# Altium schematic symbol library NXP_60_26022015.SCHLIB: 1306 symbols (part 27 of 28) (continued)
## SSL5511T
designator U?, comment Greenchip controller for LED lighting with DIM pin The SSL5511T is an offline dimmable controller IC, intended to drive dimmable LEDs in general lighting applications, like remote-controlled luminaires and smart lamps. The main benefits of this IC include: • Dim level control with either an analog or a digital control input • Selectable modes for high power factor or low ripple, allowing a wide LED power range • Large dimming range • Single stage topology for small PCB footprint • Ease of design-in • Integrated start-up JFET • Low electronic Bill Of Material (BOM) • Various converter topologies supported The IC drives an external switch for easy power scaling. It has been designed to start up directly from the High-Voltage (HV) supply by an internal high-voltage current source. Flyback, buck and buck-boost circuit topologies are supported. Primary side sensing provides accurate output current control. The IC can detect analog signals (according to IEC60929 annex E) or digital control signals and translate them to a continuous LED current in multiple ways. It can operate in three switching modes at two switching frequency ranges. It offers tradeoffs between the output current ripple, the mains current Total Harmonic Distortion (THD) and the application size. The IC incorporates all required protection features.    AAL Eindhoven MK
footprint SOT96-1
pins: 1 RMAINS (power), 2 VCC (power), 3 DIM, 4 TST, 5 ISNS, 6 PWRDRV (out), 7 GND (power), 8 DRAIN

## SSL8516T
designator U?, comment Greenchip PFC and flyback controller The GreenChip is the latest generation of green Switched Mode Power Supply (SMPS) controller ICs. The SSL8516T combines a controller for Power Factor Correction (PFC) and a flyback controller. Its high level of integration enables cost-effective LED lighting application power supply design using a very low number of external components. The PFC operates in Quasi-Resonant (QR) or Discontinuous Conduction Mode (DCM), with valley switching. The specially built-in green functions provide high efficiency at all power levels. At high power levels, the flyback operates in QR mode or DCM with valley detection. At medium power levels, the flyback controller switches to Frequency Reduction (FR) mode and limits the peak current to an adjustable minimum value. It ensures high efficiency while minimizing the audible noise from the transformer. In low-power mode, the PFC switches off to maintain high efficiency. Valley switching is used in all operating modes. The SSL8516T is a Multi-Chip Module (MCM), containing two chips. The proprietary high-voltage BCD800 process makes direct start-up possible from the rectified universal mains voltage in an effective and green way. The second low voltage Silicon-On-Insulator (SOI) is used for accurate, high-speed protection functions and control. The SSL8516T enables easy design of highly efficient and reliable LED lighting application power supplies between 25 W and 300 W. LED drivers in particular benefit from the high level of integration. The IC meets the lighting class C requirements on mains current harmonics as specified by IEC 61000-3-2 over a wide input voltage range and a wide output power range.    AAL Eindhoven MK
footprint SOT109-1
pins: 1 VCC (power), 2 GND (power), 3 FBCTRL, 4 FBAUX, 5 LATCH, 6 PFCCOMP, 7 VINSENSE, 8 PCFAUX, 9 VOSENSE, 10 FBSENSE, 11 PFCSENSE, 12 PFCDRIVER (out), 13 FBDRIVER (out), 14 PFCTIMER, 15 HVS, 16 HV

## TDA8037T
designator U?, comment Low power 3V smart card interface The TDA8037 is the cost efficient successor of the established integrated contact smart card reader IC TDA8035. It offers a high level of security for the card performing current limitation, short circuit detection, ESD protection as well as supply supervision. Operating in 3 V supply domain, the current consumption during the shutdown mode of the contact reader is very low. It is therefore the ideal component for a power efficient contact reader.   AAL Eindhoven MK
footprint SOT136-1
pins: 1 CLKDIV, 4 TEST, 6 VDD, 9 !PRES, 11 I/O, 12 AUX2, 13 AUX1, 14 GND, 15 CLK (out), 16 RST (out), 17 VCC, 18 PORADJ (out), 19 !CMDVCC, 20 RSTIN, 21 CS, 23 !OFF (out), 24 CLKIN, 26 I/OUC, 27 AUX1UC, 28 AUX2UC

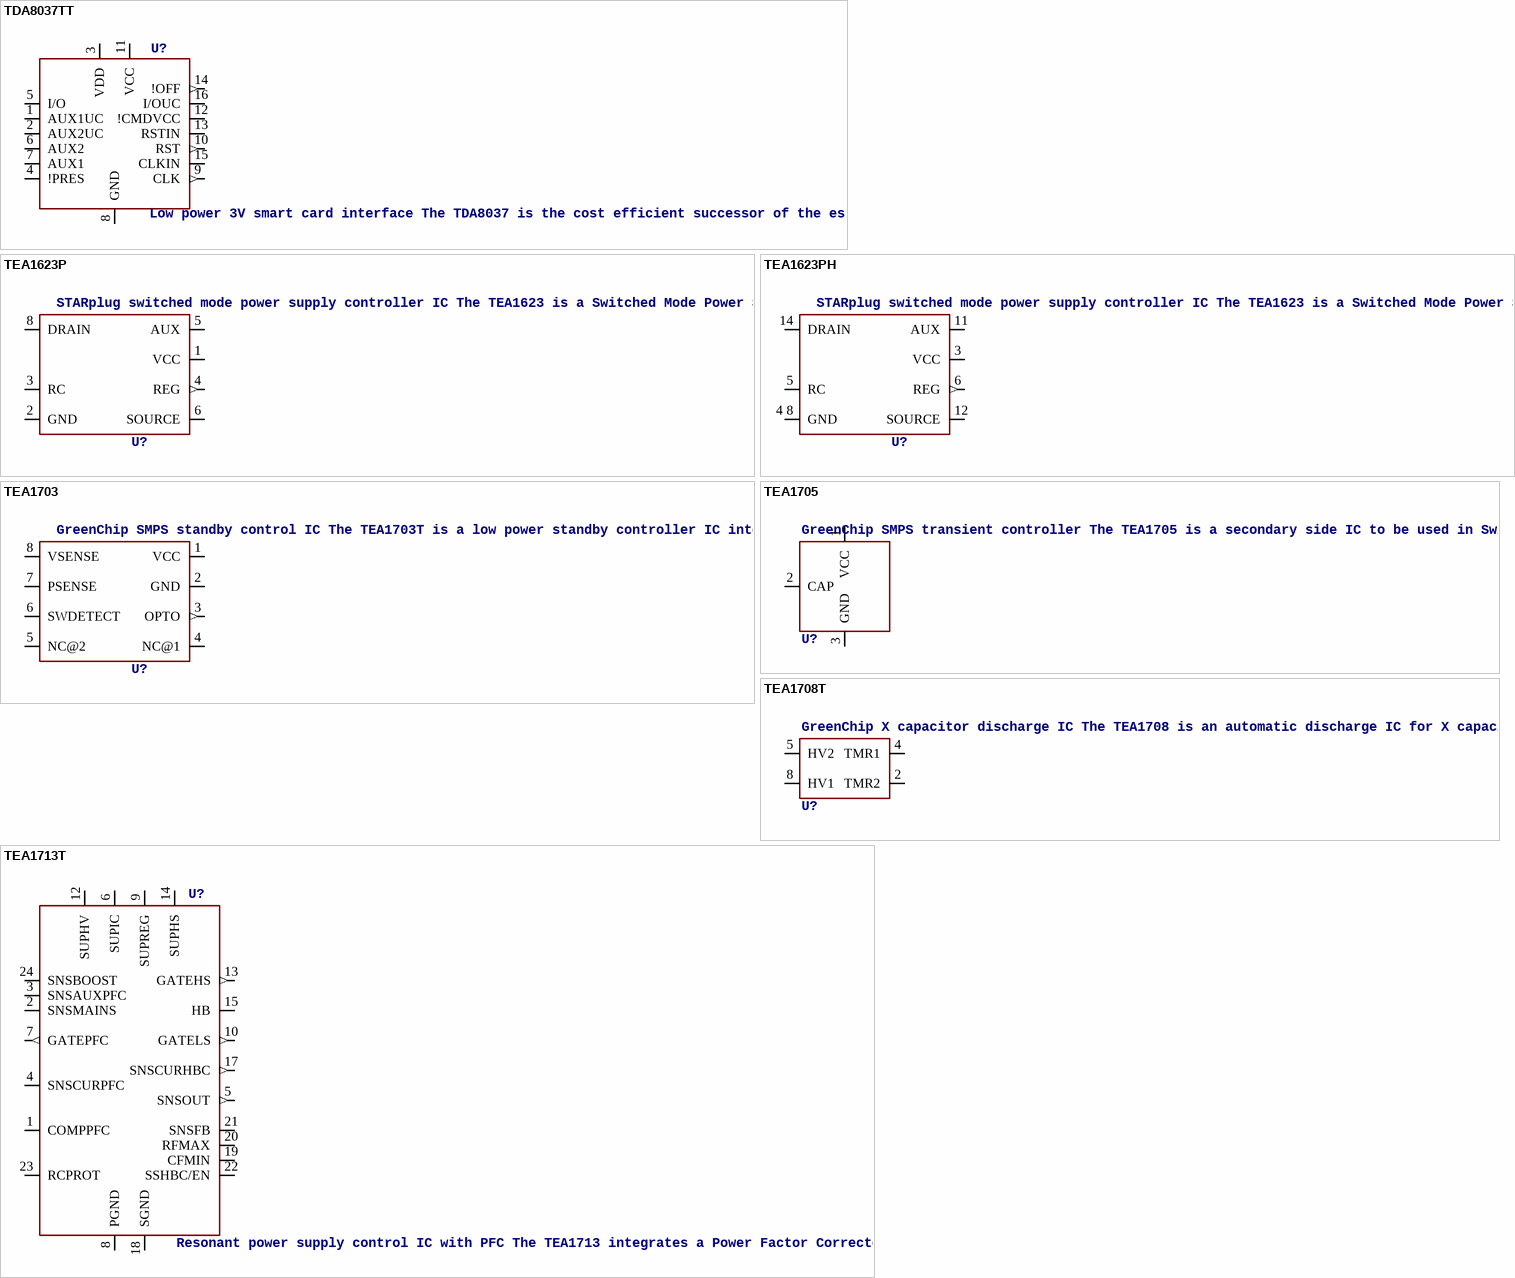
[diagram p180: symbols TDA8037TT to TEA1713T]

## TDA8037TT
designator U?, comment Low power 3V smart card interface The TDA8037 is the cost efficient successor of the established integrated contact smart card reader IC TDA8035. It offers a high level of security for the card performing current limitation, short circuit detection, ESD protection as well as supply supervision. Operating in 3 V supply domain, the current consumption during the shutdown mode of the contact reader is very low. It is therefore the ideal component for a power efficient contact reader.   AAL Eindhoven MK
footprint SOT403-1
pins: 1 AUX1UC, 2 AUX2UC, 3 VDD, 4 !PRES, 5 I/O, 6 AUX2, 7 AUX1, 8 GND, 9 CLK (out), 10 RST (out), 11 VCC, 12 !CMDVCC, 13 RSTIN, 14 !OFF (out), 15 CLKIN, 16 I/OUC

## TEA1623P
designator U?, comment STARplug switched mode power supply controller IC The TEA1623 is a Switched Mode Power Supply (SMPS) controller IC that operates directly from rectified universal mains. It is implemented in the high voltage EZ-HV SOI process, combined with a low voltage BiCMOS process. The device includes a high voltage power switch and a circuit for start-up directly from the rectified mains voltage. A dedicated circuit for valley switching is built in, which makes a very efficient slim-line electronic power-plug concept possible. In its most basic version of application, the TEA1623 acts as a voltage source. Here, no additional secondary electronics are required. A combined voltage and current source can be realized with minimum costs for external components. Implementation of the TEA1623 renders an efficient and low cost power supply system.    AAL Eindhoven MK
footprint SOT97-1
pins: 1 VCC (power), 2 GND, 3 RC, 4 REG (out), 5 AUX, 6 SOURCE, 8 DRAIN

## TEA1623PH
designator U?, comment STARplug switched mode power supply controller IC The TEA1623 is a Switched Mode Power Supply (SMPS) controller IC that operates directly from rectified universal mains. It is implemented in the high voltage EZ-HV SOI process, combined with a low voltage BiCMOS process. The device includes a high voltage power switch and a circuit for start-up directly from the rectified mains voltage. A dedicated circuit for valley switching is built in, which makes a very efficient slim-line electronic power-plug concept possible. In its most basic version of application, the TEA1623 acts as a voltage source. Here, no additional secondary electronics are required. A combined voltage and current source can be realized with minimum costs for external components. Implementation of the TEA1623 renders an efficient and low cost power supply system.    AAL Eindhoven MK
footprint SOT38
pins: 3 VCC (power), 4 8 GND, 5 RC, 6 REG (out), 11 AUX, 12 SOURCE, 14 DRAIN

## TEA1703
designator U?, comment GreenChip SMPS standby control IC The TEA1703T is a low power standby controller IC intended to be used in applications which require an extreme low no-load standby power. The TEA1703T includes circuitry for detecting output voltage, output power and switching. The TEA1703T integrates a switched-mode optocoupler driver, which enables an optocoupler to be driven with a high peak current while keeping the required power low1 . The TEA1703T’s typical current consumption is 30 μA. In a typical notebook adapter application the TEA1703T’s power consumption is less than 0.5 mW.    AAL Eindhoven MK
footprint SOT96-1
pins: 1 VCC (power), 2 GND (power), 3 OPTO (out), 4 NC@1, 5 NC@2, 6 SWDETECT, 7 PSENSE, 8 VSENSE

## TEA1705
designator U?, comment GreenChip SMPS transient controller The TEA1705 is a secondary side IC to be used in Switched Mode Power Supplies (SMPS) with high power density. The device offers excellent transient response in primary controlled systems of NXP Semiconductors, with ultra-low no-load power and minimum sized output capacitors. The TEA1705 is intended to be used in power supplies and battery chargers with 5 V output. The TEA1705 operates in combination with the NXP Semiconductors primary-side controller like the TEA1720xT. The output voltage is continuously monitored and when the output voltage is below the Vdet level, a transient interrupt signal is generated. This signal is transmitted via the transformer to the primary side to wake up the primary controller. This system reduces the volume of the output capacitors, minimizing the BOM cost. It also enables the building of compact chargers.    AAL Eindhoven MK
footprint SOT23
pins: 1 VCC (power), 2 CAP, 3 GND (power)

## TEA1708T
designator U?, comment GreenChip X capacitor discharge IC The TEA1708 is an automatic discharge IC for X capacitors with a low power consumption (typically 1 mW at 230 V (AC). A 500 V clamping circuit is integrated, protecting the IC during mains surges. In a typical application with only two 200 k resistors, the maximum differential mode mains surge voltage allowed exceeds 6 kV. A metal oxide varistor is not required to protect the IC. The X capacitor discharge current is internally limited to 2.3 mA. The discharge delay timer is set externally using a low voltage capacitor. The very low power consumption in combination with a large discharge current enables the use of a large value X capacitor to reduce EMI while retaining the low standby power.    AAL Eindhoven MK
footprint SOT96-1
pins: 2 TMR2, 4 TMR1, 5 HV2, 8 HV1

## TEA1713T
designator U?, comment Resonant power supply control IC with PFC The TEA1713 integrates a Power Factor Corrector (PFC) controller and a controller for a Half-Bridge resonant Converter (HBC) in a multi-chip IC. It provides the drive function for the discrete MOSFET in an up-converter and for the two discrete power MOSFETs in a resonant half-bridge configuration. The efficient operation of the PFC is achieved by implementing functions such as quasi-resonant operation at high power levels and quasi-resonant operation with valley skipping at lower power levels. OverCurrent Protection (OCP), OverVoltage Protection (OVP), and demagnetization sensing ensure safe operation under all conditions. The HBC module is a is a high-voltage controller for a zero-voltage switching LLC resonant converter. It contains a high-voltage level shift circuit and several protection circuits including OCP, open-loop protection, capacitive mode protection and a general purpose latched protection input. The high-voltage chip is fabricated using a proprietary high-voltage Bipolar-CMOS-DMOS power logic process that enables efficient direct start-up from the rectified universal mains voltage. The low-voltage Silicon On Insulator (SOI) chip is used for accurate, high-speed protection functions and control. The topology of a PFC circuit and a resonant converter controlled by the TEA1713 is very flexible, enabling it to be used in a broad range of applications with a wide mains voltage range. Combining PFC and HBC controllers in a single IC makes the TEA1713 ideal for controlling power supplies in LCD and plasma televisions. Highly efficient and reliable power supplies providing over 100 W can be designed easily using the TEA1713, with a minimum of external components.    AAL Eindhoven MK
12NC: 9352 895 98518; FARNELL: 1872212
footprint SOT137-1
pins: 1 COMPPFC, 2 SNSMAINS, 3 SNSAUXPFC, 4 SNSCURPFC, 5 SNSOUT (out), 6 SUPIC (power), 7 GATEPFC (out), 8 PGND (power), 9 SUPREG, 10 GATELS (out), 12 SUPHV, 13 GATEHS (out), 14 SUPHS, 15 HB, 17 SNSCURHBC (out), 18 SGND (power), 19 CFMIN, 20 RFMAX, 21 SNSFB, 22 SSHBC/EN, 23 RCPROT, 24 SNSBOOST

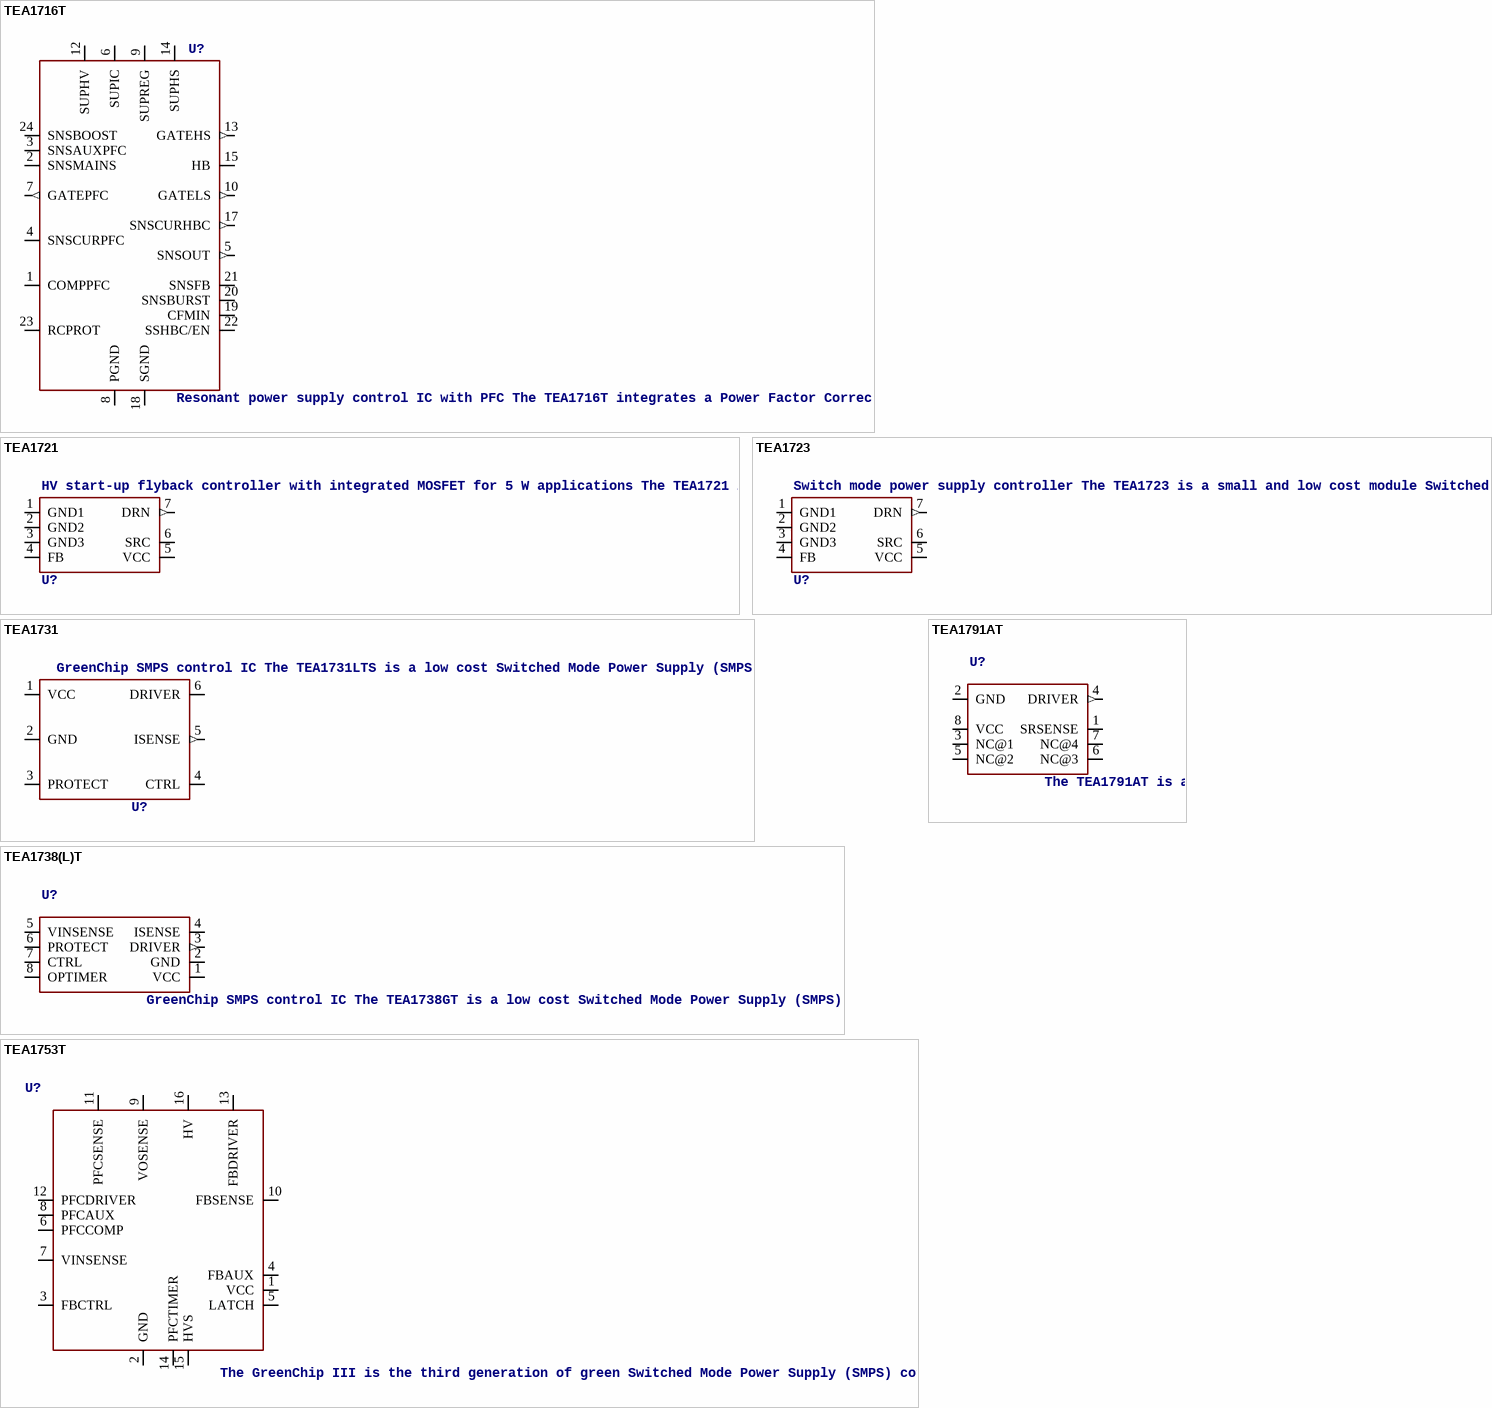
[diagram p181: symbols TEA1716T to TEA1791AT]

## TEA1716T
designator U?, comment Resonant power supply control IC with PFC The TEA1716T integrates a Power Factor Corrector (PFC) controller and a controller for a Half-Bridge resonant Converter (HBC) in a multi-chip IC. It provides the drive function for the discrete MOSFET in an up-converter and for the two discrete power MOSFETs in a resonant half-bridge configuration. Efficient PFC operation is achieved by implementing functions for Quasi-Resonant (QR) operation at high-power levels and QR operation with valley skipping at lower power levels. OverCurrent Protection (OCP), OverVoltage Protection (OVP) and demagnetization sensing ensure safe operation under all conditions. The HBC module is a high-voltage controller for a zero-voltage switching LLC resonant converter. It contains a high-voltage level shift circuit and several protection circuits including OCP, open-loop protection, capacitive mode protection and a general purpose latched protection input. The high-voltage chip is fabricated using a proprietary high-voltage Bipolar-CMOS-DMOS power logic process enabling efficient direct start-up from the rectified universal mains voltage. The low-voltage Silicon-On-Insulator (SOI) chip is used for accurate, high-speed protection functions and control. TEA1716T controlled PFC circuit and resonant converter are very flexible. It can be used for a broad range of applications over a wide mains voltage range. Combining PFC and HBC controllers in a single IC makes the TEA1716T ideal for controlling power supplies in LCD and plasma televisions. Using the TEA1716T highly efficient and reliable power supplies providing from 90 W to 500 W can be designed easily using the TEA1716T, with a minimum of external components. The integrated Burst mode and power management functionality of TEA1716T enable resonant applications that meet the Energy Using Product Directive (EuP) lot 6 (< 0.5 W in Standby mode).   AAL Eindhoven MK
footprint SOT137-1
pins: 1 COMPPFC, 2 SNSMAINS, 3 SNSAUXPFC, 4 SNSCURPFC, 5 SNSOUT (out), 6 SUPIC (power), 7 GATEPFC (out), 8 PGND (power), 9 SUPREG, 10 GATELS (out), 12 SUPHV, 13 GATEHS (out), 14 SUPHS, 15 HB, 17 SNSCURHBC (out), 18 SGND (power), 19 CFMIN, 20 SNSBURST, 21 SNSFB, 22 SSHBC/EN, 23 RCPROT, 24 SNSBOOST

## TEA1721
designator U?, comment HV start-up flyback controller with integrated MOSFET for 5 W applications The TEA1721 is a small and low cost module Switched Mode Power Supply (SMPS) controller IC for low power applications (up to 5 W) and operates directly from the rectified universal mains input. The device includes a high voltage power switch (700 V) and has been optimized for flyback converter topologies to provide high-efficiency over the entire load range with ultra-low power consumption in the no-load condition. It provides a circuit for start-up directly from the rectified mains voltage without any external bleeder circuits. The converter operates as a regulated voltage source from no-load up to the maximum output current and operates as current source that delivers the maximum current over a broad output voltage range. Using the TEA1721, a low power converter can be built at minimum cost and with the minimum number of external components. The controller regulates the output voltage with primary-side sensing which eliminates the need for an additional secondary feedback circuitry and simplifies the design. At higher power levels, a frequency and current control mode is used. It operates with Burst mode control at low power levels and no-load condition. The burst mode minimizes audible noise and provides an energy saver state which reduces the power consumption in no-load condition.    AAL Eindhoven MK
12NC: 9352 968 88118; BURST: 430 Hz; 12NC: 9352 968 94118; BURST: 905 Hz; 12NC: 9352 968 89118; BURST: 1270 Hz; 12NC: 9352 968 87118; BURST: 1750 Hz
footprint SOT1175-1
pins: 1 GND1 (power), 2 GND2 (power), 3 GND3 (power), 4 FB, 5 VCC (power), 6 SRC, 7 DRN (out)

## TEA1723
designator U?, comment Switch mode power supply controller The TEA1723 is a small and low cost module Switched Mode Power Supply (SMPS) controller IC for power applications (up to 11 W) and operates directly from the rectified universal mains input. The device includes a high voltage power switch (700 V) and has been optimized for flyback converter topologies to provide high-efficiency over the entire load range with ultra-low power consumption in the no-load condition. It provides a circuit for start-up directly from the rectified mains voltage without any external bleeder circuits. The converter operates as a regulated voltage source from no-load up to the maximum output current and operates as current source that delivers the maximum current over a broad output voltage range. Using the TEA1723, a low power converter can be built at minimum cost and with the minimum number of external components. The controller regulates the output voltage with primary-side sensing which eliminates the need for an additional secondary feedback circuitry and simplifies the design. At higher power levels, a frequency and current control mode is used. It operates with burst mode control at low power levels and no-load condition. The burst mode minimizes audible noise and provides an energy saver state which reduces the power consumption in no-load condition. The Burst mode frequency of 1750 Hz enables no-load power consumption < 53 mW at 230 V (AC) mains input.    AAL Eindhoven MK
12NC: 9352 968 88118
footprint SOT1175-1
pins: 1 GND1 (power), 2 GND2 (power), 3 GND3 (power), 4 FB, 5 VCC (power), 6 SRC, 7 DRN (out)

## TEA1731
designator U?, comment GreenChip SMPS control IC The TEA1731LTS is a low cost Switched Mode Power Supply (SMPS) controller IC intended for flyback topologies. The TEA1731LTS operates in peak current and frequency control mode. Frequency jitter has been implemented to reduce ElectroMagnetic Interference (EMI). Slope compensation is integrated for Continuous Conduction Mode (CCM) operation. The TEA1731LTS IC features OverPower Protection (OPP). The controller accepts an overpower situation for a limited amount of time. One pin is reserved for protection purposes. OverTemperature Protection (OTP) can be implemented with a minimal number of external components. At low-power levels, the primary peak current is set to 25 % of the maximum peak current. The switching frequency is reduced to limit the switching losses. The combination of fixed frequency operation at high output power and frequency reduction at low output power provides high efficiency over the total load range. The TEA1731LTS makes the design of low cost, highly efficient and reliable supplies for power requirements up to 75 W easier by requiring a minimum number of external components.    AAL Eindhoven MK
12NC: 9352 965 45115; 12NC: 9352 965 44115; FARNELL: 2142714
footprint SOT457
pins: 1 VCC (power), 2 GND, 3 PROTECT, 4 CTRL, 5 ISENSE (out), 6 DRIVER

## TEA1738(L)T
designator U?, comment GreenChip SMPS control IC The TEA1738GT is a low cost Switched Mode Power Supply (SMPS) controller IC intended for flyback topologies. It operates in peak current and frequency control mode. Frequency jitter has been implemented to reduce ElectroMagnetic Interference (EMI). Slope compensation is integrated for Continuous Conduction Mode (CCM) operation. The TEA1738GT IC includes OverPower Protection (OPP). This enables the controller to operate under overpower situations for a limited amount of time. Two pins, VINSENSE and PROTECT, are reserved for protection purposes. Input UnderVoltage Protection (UVP), output OverVoltage Protection (OVP) and OverTemperature Protection (OTP) can be implemented using a minimal number of external components. At low power levels the primary peak current is set to 25 % of the maximum peak current and the switching frequency is reduced to limit switching losses. The combination of fixed frequency operation at high output power and frequency reduction at low output power provides high efficiency over the total load range. The TEA1738GT enables low cost, highly efficient and reliable supplies for power requirements up to 75 W to be designed easily and with a minimum number of external components. The TEA1738GT is intended to operate in combination with a standby power supply. It has a lower start-up voltage than the TEA1738    AAL Eindhoven MK
12NC: 9352 918 76118
footprint SOT96-1
pins: 1 VCC (power), 2 GND (power), 3 DRIVER (out), 4 ISENSE, 5 VINSENSE, 6 PROTECT, 7 CTRL, 8 OPTIMER

## TEA1753T
designator U?, comment The GreenChip III is the third generation of green Switched Mode Power Supply (SMPS) controller ICs. The GreenChip III combines a controller for Power Factor Correction (PFC) and a flyback controller. Its high level of integration allows the design of a cost-effective power supply with a very low number of external components.   AAL Eindhoven MK
12NC: 9352 932 05518
footprint SOT109-1
pins: 1 VCC, 2 GND, 3 FBCTRL, 4 FBAUX, 5 LATCH, 6 PFCCOMP, 7 VINSENSE, 8 PFCAUX, 9 VOSENSE, 10 FBSENSE, 11 PFCSENSE, 12 PFCDRIVER, 13 FBDRIVER, 14 PFCTIMER, 15 HVS, 16 HV

## TEA1791AT
designator U?, comment The TEA1791AT is a member of the new generation of Synchronous Rectifier (SR) controller ICs for switched mode power supplies. Its high level of integration allows the design of a cost-effective power supply with a very low number of external components.   AAL Eindhoven MK
12NC: 9352 901 57118
footprint SOT96-1
pins: 1 SRSENSE, 2 GND (power), 3 NC@1, 4 DRIVER (out), 5 NC@2, 6 NC@3, 7 NC@4, 8 VCC (power)

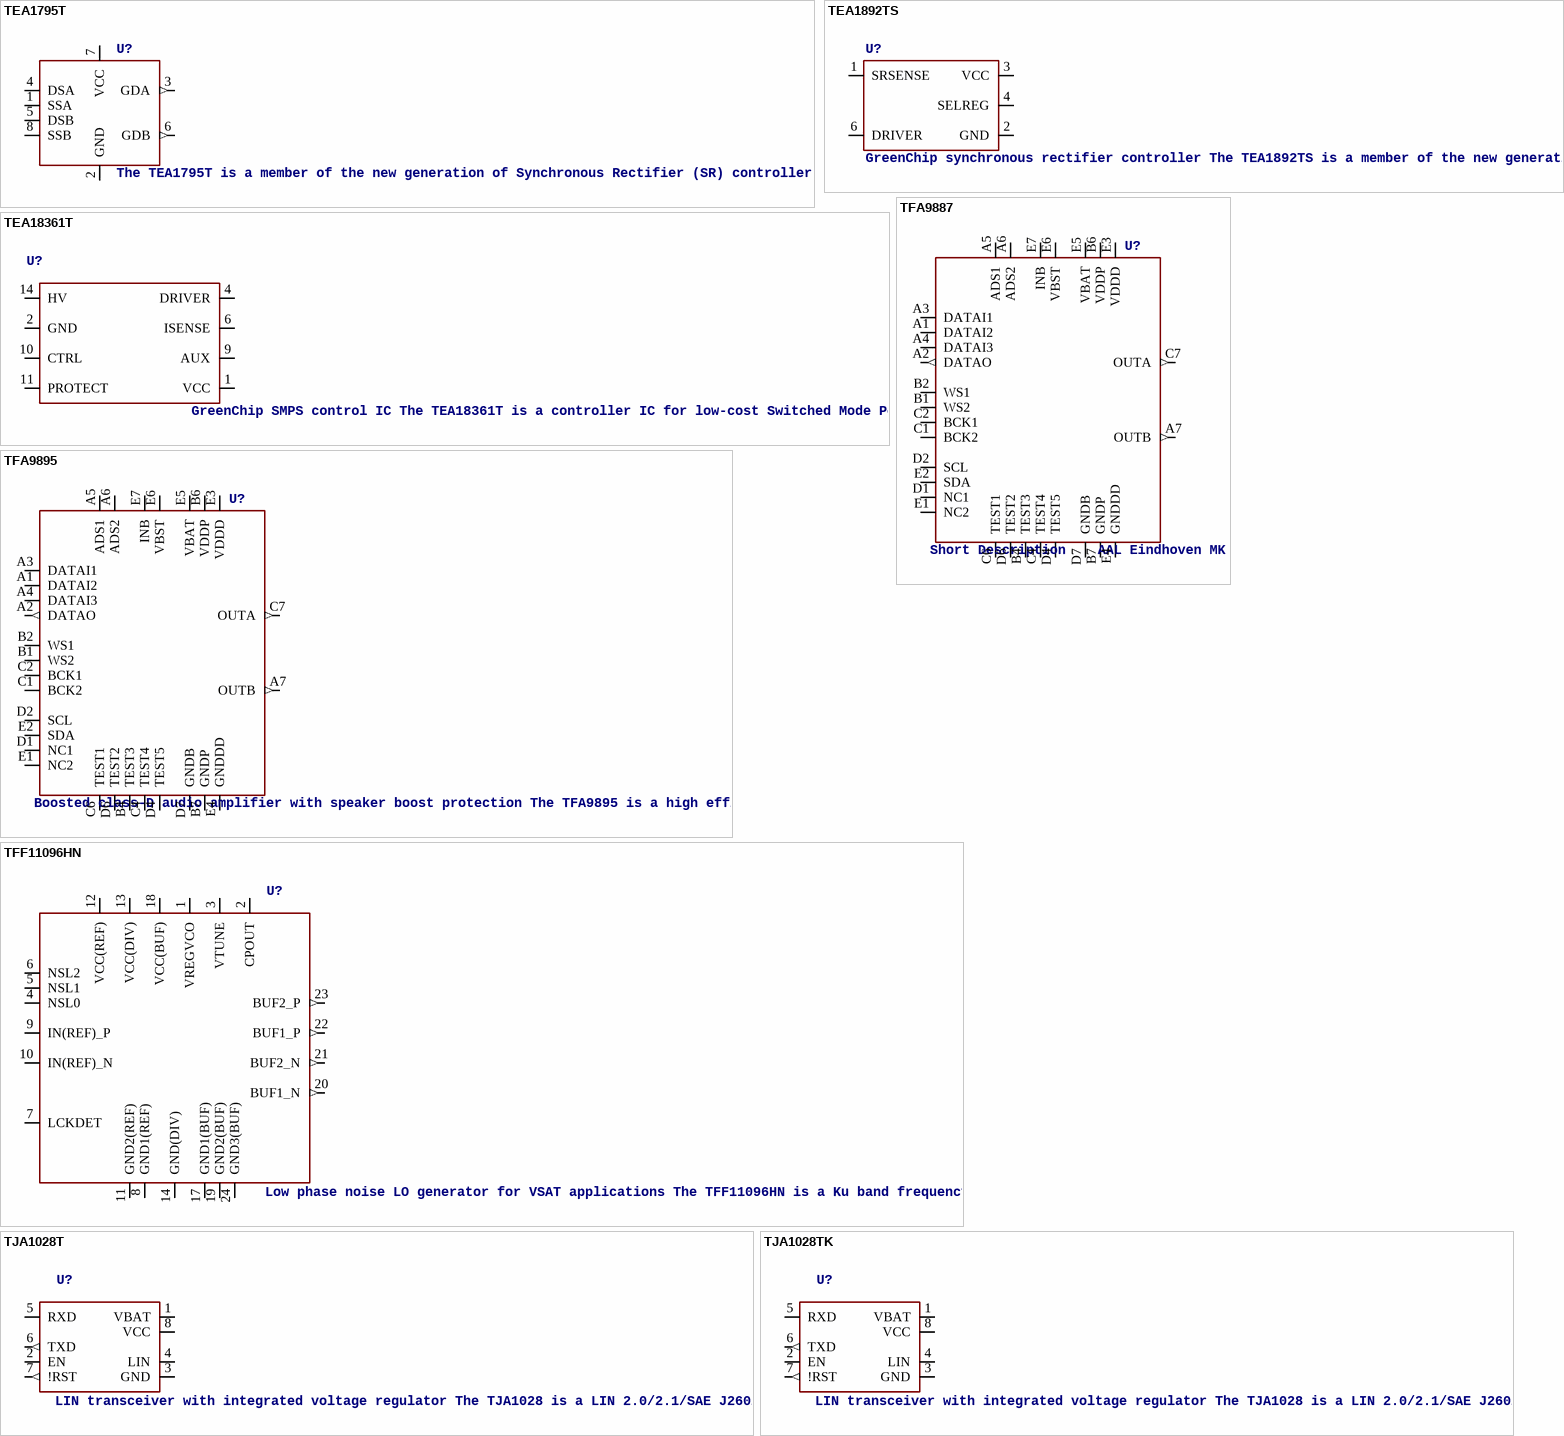
[diagram p182: symbols TEA1795T to TJA1028TK]

## TEA1795T
designator U?, comment The TEA1795T is a member of the new generation of Synchronous Rectifier (SR) controller ICs for switched mode power supplies. Its high level of integration enables the design of a cost-effective power supply with a minimum number of external components.   AAL Eindhoven MK
12NC: 9352 915 64118
footprint SOT96-1
pins: 1 SSA, 2 GND (power), 3 GDA (out), 4 DSA, 5 DSB, 6 GDB (out), 7 VCC (power), 8 SSB

## TEA1892TS
designator U?, comment GreenChip synchronous rectifier controller The TEA1892TS is a member of the new generation of Synchronous Rectifier (SR) controller ICs for switched mode power supplies. Its high level of integration allows the design of a cost-effective power supply with a very low number of external components. The TEA1892TS is a controller IC dedicated to synchronous rectification on the secondary side of discontinuous conduction mode and quasi-resonant flyback converters. The TEA1892TS is fabricated in a Silicon-On-Insulator (SOI) process.    AAL Eindhoven MK
footprint SOT457
pins: 1 SRSENSE, 2 GND (power), 3 VCC (power), 4 SELREG, 6 DRIVER

## TEA18361T
designator U?, comment GreenChip SMPS control IC The TEA18361T is a controller IC for low-cost Switched Mode Power Supplies (SMPS). It is intended for flyback topologies. The built-in green functions provide high efficiency at all power levels. At high power levels the flyback operates in Quasi-Resonant (QR) mode. At lower power levels, the controller switches to Frequency Reduction (FR) or Discontinuous Conduction Mode (DCM) and limits the peak current to approximately 25 % of the maximum peak current. Valley switching is used in all operating modes. At low power levels, when the flyback switching frequency drops below 25 kHz, the flyback converter switches to burst mode. A special burst mode has been integrated which reduces the opto current to a minimum level, ensuring high efficiency at low power and excellent no load power performance. As the switching frequency in this mode has a minimum value of 25 kHz while the burst frequency is below 800 Hz, the frequencies are outside the audible range. During the non-switching phase of the burst mode, the internal IC supply current is minimized for further efficiency optimization. The TEA18361T includes an accurate OverPower Protection (OPP). The OPP enables the controller to operate in overpower situations for a limited amount of time. If the output is shorted, the system switches to low-power mode where the output power is limited to a lower level. The TEA18361T is manufactured in a high-voltage Silicon-On-Insulator (SOI) process. The SOI process combines the advantages of a low-voltage process (accuracy, high-speed protection, functions, and control), while maintaining the high-voltage capabilities (high-voltage start-up, low standby power, and an integrated X-capacitor discharge function). The TEA18361T enables low-cost, highly efficient and reliable supplies for power requirements up to 75 W to be designed with a minimum number of external components.    AAL Eindhoven MK
footprint SOT108-1
pins: 1 VCC, 2 GND, 4 DRIVER, 6 ISENSE, 9 AUX, 10 CTRL, 11 PROTECT, 14 HV

## TFA9887
designator U?, comment Short Description    AAL Eindhoven MK
footprint WLCSP29
pins: A1 DATAI2, A2 DATAO (out), A3 DATAI1, A4 DATAI3, A5 ADS1, A6 ADS2, A7 OUTB (out), B1 WS2, B2 WS1, B4 TEST3, B6 VDDP (power), B7 GNDP (power), C1 BCK2, C2 BCK1, C4 TEST4, C6 TEST1, C7 OUTA (out), D1 NC1, D2 SCL, D4 TEST5, D6 TEST2, D7 GNDB (power), E1 NC2, E2 SDA, E3 VDDD (power), E4 GNDDD (power), E5 VBAT (power), E6 VBST (power), E7 INB (power)